# Altium footprint library DA, DD IC.PcbLib: 64 footprints (part 1 of 4)
Each footprint in its own frame and in the unit in brackets; x right, y up, seen from the top. Pads: shape width x height; smd on the part's side, far side on the other; paste and mask are expansions set on the pad; w line width, h text height; cw(c..) or ccw(c..) is an arc to the next point about the centre after c.
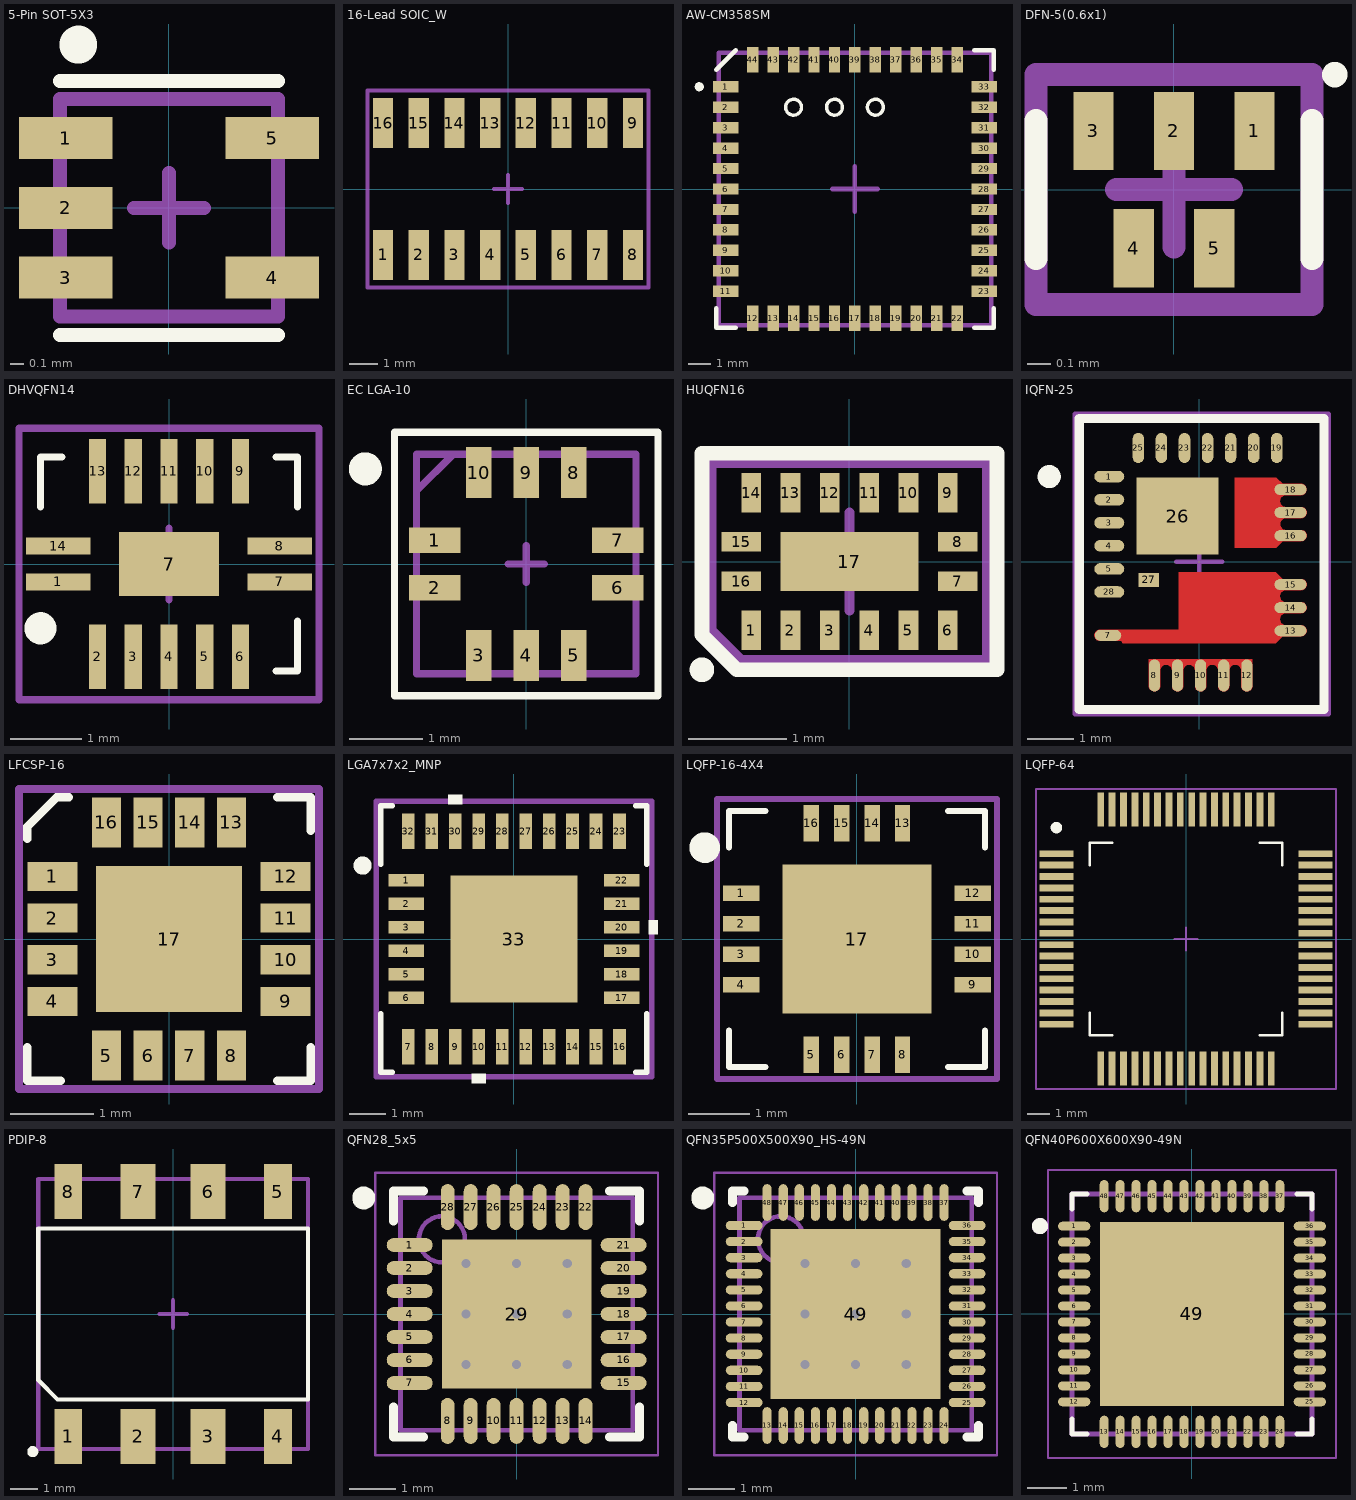
[diagram p0: the footprints below, top view; thin cyan lines are the x and y axes]

## 5-Pin SOT-5X3 [mm]
pads (5):
  rect 0.67x0.3 smd: 1(-0.74,0.5) 2(-0.74,0) 3(-0.74,-0.5) 4(0.74,-0.5) 5(0.74,0.5)
Top Overlay:
  circle w0.25: c-0.65,1.17 r0.01
  lines w0.1: -0.78,-0.91 0.78,-0.91 ; -0.78,0.91 0.78,0.91
Mechanical 15:
  lines w0.1: -0.25,0 0.25,0 ; 0,-0.25 0,0.25 ; -0.78,-0.78 -0.78,0.78 0.78,0.78 0.78,-0.78 -0.78,-0.78
3D body "SN74LVC1G14DRLRG4.STEP": height 0.59, standoff -0.01, extent -0.8,-0.8 0.8,0.8

## 16-Lead SOIC_W [mm]
pads (16):
  rect 0.72x1.78 smd: 1(-4.445,-2.34) 2(-3.175,-2.34) 3(-1.905,-2.34) 4(-0.635,-2.34) 5(0.635,-2.34) 6(1.905,-2.34) 7(3.175,-2.34) 8(4.445,-2.34) 9(4.445,2.34) 10(3.175,2.34) 11(1.905,2.34) 12(0.635,2.34) 13(-0.635,2.34) 14(-1.905,2.34) 15(-3.175,2.34) 16(-4.445,2.34)
Mechanical 15:
  lines w0.15: -0.5,0 0.5,0 ; 0,-0.5 0,0.5 ; -5,-3.5 -5,3.5 5,3.5 5,-3.5 -5,-3.5

## AW-CM358SM [mm] "AW-CM358SM"
height 1
pads (44):
  rect 1.125x0.5 smd: 1(-5.69,4.5) 2(-5.69,3.6) 3(-5.69,2.7) 4(-5.69,1.8) 6(-5.69,0) 7(-5.69,-0.9) 8(-5.69,-1.8) 9(-5.69,-2.7) 10(-5.69,-3.6) 11(-5.69,-4.5) 23(5.69,-4.5) 24(5.69,-3.6) 25(5.69,-2.7) 26(5.69,-1.8) 27(5.69,-0.9) 28(5.69,0) 29(5.69,0.9) 30(5.69,1.8) 31(5.69,2.7) 32(5.69,3.6) 33(5.69,4.5)
  rect 1.125x0.5 smd mask+0.102: 5(-5.69,0.9)
  rect 0.5x1.125 smd: 12(-4.5,-5.69) 13(-3.6,-5.69) 14(-2.7,-5.69) 15(-1.8,-5.69) 16(-0.9,-5.69) 17(0,-5.69) 18(0.9,-5.69) 19(1.8,-5.69) 20(2.7,-5.69) 21(3.6,-5.69) 22(4.5,-5.69) 34(4.5,5.69) 35(3.6,5.69) 36(2.7,5.69) 37(1.8,5.69) 38(0.9,5.69) 39(0,5.69) 40(-0.9,5.69) 41(-1.8,5.69) 42(-2.7,5.69) 43(-3.6,5.69) 44(-4.5,5.69)
Top Overlay:
  circle w0.15: c0.9,3.6 r0.35
  circle w0.15: c-0.9,3.6 r0.35
  circle w0.15: c-2.7,3.6 r0.35
  circle w0.2: c-6.85,4.5 r0.1
  lines w0.2: -6.1,-5.25 -6.1,-6.1 -5.25,-6.1 ; -6.1,5.25 -5.25,6.1 ; 5.25,-6.1 6.1,-6.1 6.1,-5.25 ; 5.25,6.1 6.1,6.1 6.1,5.25 ; -5.25,6.1 -5.25,6.1
Mechanical 15:
  lines w0.2: -1,0 1,0 ; 0,-1 0,1 ; -6,-6 -6,6 6,6 6,-6 -6,-6
3D body "User Library-AP62XX-1.step": height 1.52, standoff 0, extent -6,-6 6,6

## DFN-5(0.6x1) [mm]
pads (5):
  rect 0.175x0.34 smd mask+0.05: 1(0.35,0.255) 2(0,0.255) 3(-0.35,0.255) 4(-0.175,-0.255) 5(0.175,-0.255)
Top Overlay:
  circle w0.1: c0.7,0.5 r0.005
  lines w0.1: -0.6,-0.3 -0.6,0.3 ; 0.6,-0.3 0.6,0.3
Mechanical 15:
  lines w0.1: -0.25,0 0.25,0 ; 0,-0.25 0,0.25 ; -0.6,-0.5 -0.6,0.5 0.6,0.5 0.6,-0.5 -0.6,-0.5
3D body "DFN_04UTG_LTF.step": height 0.51, standoff 0, extent -0.546,-0.356 0.546,0.356

## DHVQFN14 [mm]
pads (15):
  rect 0.9x0.24 smd paste-0.02 mask+0.05: 1(-1.55,-0.25) 7(1.55,-0.25) 8(1.55,0.25) 14(-1.55,0.25)
  rect 0.24x0.9 smd paste-0.02 mask+0.05: 2(-1,-1.3) 3(-0.5,-1.3) 4(0,-1.3) 5(0.5,-1.3) 6(1,-1.3) 9(1,1.3) 10(0.5,1.3) 11(0,1.3) 12(-0.5,1.3) 13(-1,1.3)
  rect 1.4x0.9 smd paste-2539.97 mask+0.05: 7(0,0)
Top Overlay:
  circle w0.25: c-1.8,-0.9 r0.1
  lines w0.1: -1.8,0.8 -1.8,1.5 -1.5,1.5 ; 1.5,-1.5 1.8,-1.5 1.8,-0.8 ; 1.5,1.5 1.8,1.5 1.8,0.8
Top Paste:
  region: -0.3,0.2 -0.3,-0.2 0.3,-0.2 0.3,0.2
Mechanical 15:
  lines w0.1: -0.5,0 0.5,0 ; 0,-0.5 0,0.5 ; -2.1,-1.9 -2.1,1.9 2.1,1.9 2.1,-1.9 -2.1,-1.9
3D body "User Library-DHVQFN 14.step": height 0.85, standoff -0.02, extent -1.501,-1.251 1.501,1.251

## EC LGA-10 [mm] "3mmx3mmx1.45mm"
height 1.45
pads (10):
  rect 0.7x0.35 smd: 1(-1.25,0.325) 2(-1.25,-0.325) 6(1.25,-0.325) 7(1.25,0.325)
  rect 0.35x0.7 smd: 3(-0.65,-1.25) 4(0,-1.25) 5(0.65,-1.25) 8(0.65,1.25) 9(0,1.25) 10(-0.65,1.25)
Top Overlay:
  circle w0.25: c-2.2,1.3 r0.1
  lines w0.1: -1.8,-1.8 1.8,-1.8 1.8,1.8 -1.8,1.8 -1.8,-1.8
Mechanical 15:
  lines w0.1: -1.5,1 -1,1.5 ; -0.25,0 0.25,0 ; 0,-0.25 0,0.25 ; -1.5,-1.5 1.5,-1.5 1.5,1.5 -1.5,1.5 -1.5,-1.5

## HUQFN16 [mm] "1.6x2.4x0.5 mm"
pads (17):
  rect 0.2x0.4 smd mask+0.05: 1(-1,-0.7) 2(-0.6,-0.7) 3(-0.2,-0.7) 4(0.2,-0.7) 5(0.6,-0.7) 6(1,-0.7) 9(1,0.7) 10(0.6,0.7) 11(0.2,0.7) 12(-0.2,0.7) 13(-0.6,0.7) 14(-1,0.7)
  rect 0.4x0.2 smd mask+0.05: 7(1.1,-0.2) 8(1.1,0.2) 15(-1.1,0.2) 16(-1.1,-0.2)
  rect 1.4x0.6 smd mask+0.05: 17(0,0)
Top Overlay:
  circle w0.15: c-1.5,-1.1 r0.05
  lines w0.15: -1.5,-0.745 -1.145,-1.1 1.5,-1.1 1.5,1.1 -1.5,1.1 -1.5,-0.745
Mechanical 15:
  lines w0.1: -0.5,0 0.5,0 ; 0,-0.5 0,0.5 ; -1.4,-0.7 -1.1,-1 1.4,-1 1.4,1 -1.4,1 -1.4,-0.7
3D body "HUQFN16.STEP": height 0.53, standoff 0, extent -1.2,-0.8 1.2,0.8

## IQFN-25 [mm]
pads (27):
  rrect100% 0.65x0.25 smd paste-0.125 mask+0: 1(-1.95,1.844) 2(-1.95,1.344) 3(-1.95,0.844) 4(-1.95,0.344) 5(-1.95,-0.156) 28(-1.95,-0.656)
  rrect100% 0.575x0.24 smd paste-0.125 mask+0: 7(-1.977,-1.596)
  rrect100% 0.24x0.695 smd paste-0.125 mask-0.7: 8(-0.97,-2.464) 9(-0.47,-2.464) 10(0.03,-2.464) 11(0.53,-2.464) 12(1.03,-2.464)
  rrect100% 0.695x0.24 smd paste-0.125 mask-0.7: 13(1.977,-1.496) 14(1.977,-0.996) 15(1.977,-0.496) 16(1.977,0.564) 17(1.977,1.064) 18(1.977,1.564)
  rrect100% 0.25x0.65 smd paste-0.125 mask+0: 19(1.68,2.464) 20(1.179,2.464) 21(0.68,2.464) 22(0.18,2.464) 23(-0.32,2.464) 24(-0.82,2.464) 25(-1.32,2.464)
  rect 1.78x1.67 smd paste-0.975 mask+0: 26(-0.471,0.989)
  rect 0.45x0.3 smd paste-0.15 mask+0: 27(-1.096,-0.396)
Top Layer:
  region: 1.655,-0.226 1.806,-0.376 2.205,-0.376 2.229,-0.376 2.272,-0.394 2.306,-0.428 2.324,-0.471 2.324,-0.495 2.324,-0.497 2.324,-0.521 2.306,-0.564 2.272,-0.598 2.229,-0.616 2.205,-0.616 1.875,-0.616 1.851,-0.618 1.805,-0.637 1.77,-0.672 1.751,-0.718 1.749,-0.742 1.749,-0.749 1.751,-0.774 1.77,-0.82 1.805,-0.855 1.851,-0.874 1.875,-0.876 2.206,-0.876 2.229,-0.876 2.273,-0.894 2.306,-0.928 2.324,-0.971 2.324,-0.995 2.324,-0.997 2.324,-1.021 2.306,-1.064 2.272,-1.097 2.229,-1.116 2.205,-1.116 1.875,-1.116 1.851,-1.118 1.805,-1.137 1.77,-1.172 1.751,-1.217 1.749,-1.242 1.749,-1.249 1.751,-1.274 1.77,-1.319 1.805,-1.354 1.851,-1.373 1.875,-1.376 2.206,-1.376 2.229,-1.376 2.273,-1.394 2.306,-1.427 2.324,-1.471 2.324,-1.495 2.324,-1.498 2.324,-1.521 2.306,-1.565 2.272,-1.598 2.229,-1.616 2.206,-1.616 1.806,-1.616 1.655,-1.766 -1.654,-1.766 -1.693,-1.716 -2.157,-1.716 -2.18,-1.716 -2.224,-1.697 -2.258,-1.664 -2.276,-1.62 -2.276,-1.596 -2.276,-1.572 -2.258,-1.528 -2.224,-1.494 -2.18,-1.476 -2.157,-1.476 -0.444,-1.476 -0.444,-0.226
  region: 1.809,1.684 2.209,1.684 2.231,1.684 2.272,1.667 2.304,1.635 2.321,1.594 2.321,1.572 2.321,1.557 2.321,1.535 2.304,1.493 2.272,1.462 2.231,1.445 2.209,1.445 1.877,1.445 1.852,1.442 1.805,1.423 1.77,1.387 1.75,1.34 1.748,1.315 1.75,1.29 1.77,1.242 1.806,1.206 1.853,1.187 1.878,1.184 2.209,1.184 2.232,1.184 2.274,1.167 2.307,1.134 2.324,1.092 2.324,1.069 2.324,1.059 2.324,1.037 2.307,0.994 2.274,0.962 2.232,0.944 2.209,0.944 1.879,0.944 1.854,0.942 1.808,0.922 1.772,0.887 1.753,0.84 1.75,0.815 1.75,0.813 1.753,0.788 1.772,0.742 1.808,0.706 1.854,0.687 1.879,0.685 2.209,0.685 2.232,0.685 2.274,0.667 2.307,0.635 2.324,0.592 2.324,0.569 2.324,0.56 2.324,0.537 2.307,0.494 2.274,0.462 2.232,0.444 2.209,0.444 1.809,0.444 1.669,0.304 0.77,0.304 0.77,1.824 1.669,1.824
  region: 1.149,-2.116 1.149,-2.696 1.149,-2.718 1.132,-2.759 1.101,-2.79 1.06,-2.807 1.037,-2.807 1.02,-2.807 0.998,-2.807 0.958,-2.79 0.927,-2.759 0.91,-2.718 0.91,-2.696 0.91,-2.366 0.909,-2.366 0.909,-2.362 0.907,-2.336 0.887,-2.289 0.851,-2.254 0.804,-2.234 0.779,-2.232 0.754,-2.234 0.707,-2.254 0.671,-2.289 0.652,-2.336 0.649,-2.362 0.649,-2.696 0.649,-2.718 0.632,-2.758 0.601,-2.79 0.56,-2.807 0.538,-2.807 0.52,-2.807 0.498,-2.807 0.458,-2.79 0.426,-2.758 0.409,-2.718 0.409,-2.696 0.409,-2.362 0.407,-2.336 0.388,-2.289 0.352,-2.254 0.305,-2.234 0.279,-2.232 0.254,-2.234 0.207,-2.254 0.171,-2.289 0.152,-2.336 0.149,-2.362 0.149,-2.696 0.149,-2.718 0.132,-2.759 0.101,-2.79 0.061,-2.807 0.039,-2.807 0.021,-2.807 -0.001,-2.807 -0.042,-2.79 -0.073,-2.758 -0.09,-2.718 -0.09,-2.696 -0.09,-2.362 -0.093,-2.336 -0.112,-2.289 -0.148,-2.254 -0.195,-2.234 -0.22,-2.232 -0.246,-2.234 -0.293,-2.254 -0.329,-2.289 -0.348,-2.336 -0.35,-2.362 -0.35,-2.696 -0.35,-2.718 -0.367,-2.758 -0.399,-2.79 -0.439,-2.807 -0.461,-2.807 -0.48,-2.807 -0.501,-2.807 -0.542,-2.79 -0.573,-2.759 -0.59,-2.718 -0.59,-2.696 -0.59,-2.366 -0.591,-2.366 -0.591,-2.361 -0.593,-2.336 -0.613,-2.289 -0.648,-2.253 -0.695,-2.234 -0.721,-2.232 -0.746,-2.234 -0.793,-2.253 -0.828,-2.289 -0.848,-2.336 -0.85,-2.361 -0.85,-2.696 -0.85,-2.718 -0.867,-2.758 -0.898,-2.79 -0.939,-2.807 -0.961,-2.807 -0.979,-2.807 -1.001,-2.807 -1.042,-2.79 -1.073,-2.759 -1.09,-2.718 -1.09,-2.696 -1.091,-2.696 -1.091,-2.116
Top Overlay:
  circle w0.25: c-3.25,1.844 r0.125
  lines w0.2: -2.6,-3.2 -2.6,3.1 2.7,3.1 2.7,-3.2 -2.6,-3.2
Top Paste:
  region: -0.571,0.174 -1.35,0.174 -1.35,0.894 -0.57,0.894
  region: -0.571,1.094 -1.35,1.094 -1.35,1.814 -0.571,1.814
  region: 0.789,-0.236 1.559,-0.236 1.559,-0.896 0.789,-0.896
  region: 0.409,1.094 -0.37,1.094 -0.37,1.814 0.41,1.814
  region: 0.409,0.174 -0.37,0.174 -0.37,0.894 0.41,0.894
  region: 0.59,-1.756 -0.431,-1.756 -0.431,-1.096 0.59,-1.096
  region: 0.59,-0.896 -0.431,-0.896 -0.431,-0.236 0.59,-0.236
  region: -0.816,-1.756 -1.315,-1.756 -1.315,-1.487 -0.816,-1.487
  region: 1.56,1.164 1.56,1.804 0.789,1.804 0.789,1.164
  region: 1.56,0.319 1.56,0.959 0.789,0.959 0.789,0.319
  region: 0.789,-1.096 1.559,-1.096 1.559,-1.756 0.789,-1.756
  region: -1.271,-0.271 -0.921,-0.271 -0.921,-0.521 -1.271,-0.521
  lines w0.24: -2.076,-1.596 -1.825,-1.596 ; 1.885,-1.496 2.135,-1.496 ; 1.885,-0.996 2.135,-0.996 ; 1.885,-0.496 2.135,-0.496 ; 1.884,0.564 2.135,0.564 ; 1.884,1.064 2.135,1.064 ; 1.884,1.564 2.135,1.564
  lines w0.25: -2.076,-0.656 -1.825,-0.656 ; -2.076,-0.156 -1.825,-0.156 ; -2.076,0.344 -1.825,0.344 ; -2.076,0.844 -1.825,0.844 ; -2.076,1.344 -1.825,1.344 ; -2.076,1.844 -1.825,1.844 ; -1.32,2.344 -1.32,2.594 ; -0.97,-2.621 -0.97,-2.241 ; -0.82,2.344 -0.82,2.594 ; -0.47,-2.621 -0.47,-2.241 ; -0.32,2.344 -0.32,2.594 ; 0.029,-2.621 0.029,-2.241 ; 0.18,2.344 0.18,2.594 ; 0.53,-2.621 0.53,-2.241 ; 0.68,2.344 0.68,2.594 ; 1.03,-2.621 1.03,-2.241 ; 1.179,2.344 1.179,2.594 ; 1.68,2.344 1.68,2.594
Mechanical 15:
  lines w0.1: -0.5,0 0.5,0 ; 0,-0.5 0,0.5 ; -2.7,-3.3 2.8,-3.3 2.8,3.2 -2.7,3.2 -2.7,-3.3
3D body "PG-IQFN-25-1_Z8B00190048_V02_3D.stp": height 1.01, standoff 0, extent -1.97,-2.516 2.03,2.484

## LFCSP-16 [mm]
pads (17):
  rect 0.6x0.35 smd mask+0.05: 1(-1.4,0.75) 2(-1.4,0.25) 3(-1.4,-0.25) 4(-1.4,-0.75) 9(1.4,-0.75) 10(1.4,-0.25) 11(1.4,0.25) 12(1.4,0.75)
  rect 0.35x0.6 smd mask+0.05: 5(-0.75,-1.4) 6(-0.25,-1.4) 7(0.25,-1.4) 8(0.75,-1.4) 13(0.75,1.4) 14(0.25,1.4) 15(-0.25,1.4) 16(-0.75,1.4)
  rect 1.75x1.75 smd mask+0.05: 17(0,0)
Top Overlay:
  lines w0.1: -1.7,-1.3 -1.7,-1.7 -1.3,-1.7 ; -1.7,1.2 -1.7,1.35 -1.35,1.7 -1.2,1.7 ; 1.3,-1.7 1.7,-1.7 1.7,-1.3 ; 1.3,1.7 1.7,1.7 1.7,1.3
Mechanical 15:
  lines w0.1: -0.5,0 0.5,0 ; 0,-0.5 0,0.5 ; -1.8,-1.8 1.8,-1.8 1.8,1.8 -1.8,1.8 -1.8,-1.8
3D body "User Library-ADP1162 LFCSP16.step": height 0.73, standoff -0.02, extent -1.501,-1.501 1.501,1.501

## LGA7x7x2_MNP [mil]
pads (33):
  rect 39x14 smd paste+0 mask+0: 1(-117.5,63.98) 2(-117.5,38.39) 3(-117.5,12.8) 4(-117.5,-12.8) 5(-117.5,-38.39) 6(-117.5,-63.98) 17(117.5,-63.98) 18(117.5,-38.39) 19(117.5,-12.8) 20(117.5,12.8) 21(117.5,38.39) 22(117.5,63.98)
  rect 14x39 smd paste+0 mask+0: 7(-115.16,-117.5) 8(-89.57,-117.5) 9(-63.98,-117.5) 10(-38.39,-117.5) 11(-12.8,-117.5) 12(12.8,-117.5) 13(38.39,-117.5) 14(63.98,-117.5) 15(89.57,-117.5) 16(115.16,-117.5) 23(115.16,117.5) 24(89.57,117.5) 25(63.98,117.5) 26(38.39,117.5) 27(12.8,117.5) 28(-12.8,117.5) 29(-38.39,117.5) 30(-63.98,117.5) 31(-89.57,117.5) 32(-115.16,117.5)
  rect 138x138 smd paste-68.5 mask+0: 33(0,0)
Top Overlay:
  circle w9.84: c-165,80 r5
  region: -30.89,-147 -45.89,-147 -45.89,-157 -30.89,-157
  region: 147,20.3 157,20.3 157,5.3 147,5.3
  region: -56.48,147 -71.48,147 -71.48,157 -56.48,157
  lines w6: -145,-81.35 -145,-145 -132.53,-145 ; -145,81.35 -145,145 -132.53,145 ; 132.53,-145 145,-145 145,-81.35 ; 132.53,145 145,145 145,81.35
Top Paste:
  region: -3.94,65.06 -65.06,65.06 -65.06,3.94 -3.94,3.94
  region: -3.94,-3.94 -65.06,-3.94 -65.06,-65.06 -3.94,-65.06
  region: 65.06,65.06 3.94,65.06 3.94,3.94 65.06,3.94
  region: 65.06,-3.94 3.94,-3.94 3.94,-65.06 65.06,-65.06
Mechanical 15:
  lines w6: -150,-150 -150,-80.98 -150,80.98 -150,150 -132.16,150 132.16,150 150,150 150,80.98 150,-80.98 150,-150 132.16,-150 -132.16,-150 -150,-150
3D body "LGA7x7x2_MNP.step": height 83.11, standoff 0, extent -140,-140 140,140

## LQFP-16-4X4 [mm]
pads (17):
  rect 0.6x0.25 smd mask+0.05: 1(-1.9,0.75) 2(-1.9,0.25) 3(-1.9,-0.25) 4(-1.9,-0.75) 9(1.9,-0.75) 10(1.9,-0.25) 11(1.9,0.25) 12(1.9,0.75)
  rect 0.25x0.6 smd mask+0.05: 5(-0.75,-1.9) 6(-0.25,-1.9) 7(0.25,-1.9) 8(0.75,-1.9) 13(0.75,1.9) 14(0.25,1.9) 15(-0.25,1.9) 16(-0.75,1.9)
  rect 2.45x2.45 smd mask+0.05: 17(0,0)
Top Overlay:
  circle w0.25: c-2.5,1.5 r0.127
  lines w0.1: -2.1,-1.5 -2.1,-2.1 -1.5,-2.1 ; -2.1,1.5 -2.1,2.1 -1.5,2.1 ; 1.5,-2.1 2.1,-2.1 2.1,-1.5 ; 1.5,2.1 2.1,2.1 2.1,1.5
Mechanical 15:
  lines w0.1: -0.5,0 0.5,0 ; 0,-0.5 0,0.5 ; -2.3,-2.3 2.3,-2.3 2.3,2.3 -2.3,2.3 -2.3,-2.3
3D body "User Library-WQFN-16 4x4mm 0_5mmPitch.step": height 0.8, standoff -0.01, extent -2.01,-2.01 2.01,2.01

## LQFP-64 [mm]
pads (64):
  rect 1.5x0.3 smd mask+0.05: 1(-5.7,3.75) 2(-5.7,3.25) 3(-5.7,2.75) 4(-5.7,2.25) 5(-5.7,1.75) 6(-5.7,1.25) 7(-5.7,0.75) 8(-5.7,0.25) 9(-5.7,-0.25) 10(-5.7,-0.75) 11(-5.7,-1.25) 12(-5.7,-1.75) 13(-5.7,-2.25) 14(-5.7,-2.75) 15(-5.7,-3.25) 16(-5.7,-3.75) 33(5.7,-3.75) 34(5.7,-3.25) 35(5.7,-2.75) 35(5.7,-1.25) 36(5.7,-2.25) 37(5.7,-1.75) 39(5.7,-0.75) 40(5.7,-0.25) 41(5.7,0.25) 42(5.7,0.75) 43(5.7,1.25) 44(5.7,1.75) 45(5.7,2.25) 46(5.7,2.75) 47(5.7,3.25) 48(5.7,3.75)
  rect 0.3x1.5 smd mask+0.05: 17(-3.75,-5.7) 18(-3.25,-5.7) 19(-2.75,-5.7) 20(-2.25,-5.7) 21(-1.75,-5.7) 22(-1.25,-5.7) 23(-0.75,-5.7) 24(-0.25,-5.7) 25(0.25,-5.7) 26(0.75,-5.7) 27(1.25,-5.7) 28(1.75,-5.7) 29(2.25,-5.7) 30(2.75,-5.7) 31(3.25,-5.7) 32(3.75,-5.7) 49(3.75,5.7) 50(3.25,5.7) 51(2.75,5.7) 52(2.25,5.7) 53(1.75,5.7) 54(1.25,5.7) 55(0.75,5.7) 56(0.25,5.7) 57(-0.25,5.7) 58(-0.75,5.7) 59(-1.25,5.7) 60(-1.75,5.7) 61(-2.25,5.7) 62(-2.75,5.7) 63(-3.25,5.7) 64(-3.75,5.7)
Top Overlay:
  circle w0.25: c-5.7,4.9 r0.127
  lines w0.1: -4.238,-3.237 -4.238,-4.237 -3.238,-4.237 ; -4.237,3.238 -4.237,4.238 -3.237,4.238 ; 3.237,-4.238 4.237,-4.238 4.237,-3.238 ; 3.238,4.237 4.238,4.237 4.238,3.237
Mechanical 15:
  lines w0.1: -0.5,0 0.5,0 ; 0,-0.5 0,0.5 ; -6.6,-6.6 6.6,-6.6 6.6,6.6 -6.6,6.6 -6.6,-6.6
3D body "User Library-LQFP64-2.STEP": height 1.62, standoff -0.01, extent -6.072,-6.072 6.072,6.072

## PDIP-8 [mm]
height 3.6
pads (8):
  rect 1x2 smd: 1(-3.81,-4.45) 4(3.81,-4.45) 5(3.81,4.45) 8(-3.81,4.45)
  rect 1.27x2 smd: 2(-1.27,-4.45) 3(1.27,-4.45) 6(1.27,4.45) 7(-1.27,4.45)
Top Overlay:
  circle w0.2: c-5.1,-5 r0.1
  lines w0.15: -4.9,-2.4 -4.2,-3.1 4.9,-3.1 4.9,3.1 -4.9,3.1 -4.9,-2.4
Mechanical 13:
  lines w0.15: -0.5,0 0.5,0 ; 0,-0.5 0,0.5 ; -4.9,-4.9 -4.9,4.9 4.9,4.9 4.9,-4.9 -4.9,-4.9
3D body "User Library-PDIP8_GW.step": height 4.32, standoff 0, extent -4.828,-5.15 4.828,5.15

## QFN28_5x5 [mm] "QFN, 28-Leads, Body 5,00x5,00mm, Pitch 0,50mm, Thermal Pad 3,25x3,25mm, IPC Medium Density"
height 0.8
pads (29):
  oval 1x0.3 smd: 1(-2.325,1.5) 2(-2.325,1) 3(-2.325,0.5) 4(-2.325,0) 5(-2.325,-0.5) 6(-2.325,-1) 7(-2.325,-1.5) 15(2.325,-1.5) 16(2.325,-1) 17(2.325,-0.5) 18(2.325,0) 19(2.325,0.5) 20(2.325,1) 21(2.325,1.5)
  oval 0.3x1 smd: 8(-1.5,-2.325) 9(-1,-2.325) 10(-0.5,-2.325) 11(0,-2.325) 12(0.5,-2.325) 13(1,-2.325) 14(1.5,-2.325) 22(1.5,2.325) 23(1,2.325) 24(0.5,2.325) 25(0,2.325) 26(-0.5,2.325) 27(-1,2.325) 28(-1.5,2.325)
  rect 3.25x3.25 smd: 29(0,0)
via 1.1,-1.1 diameter 0.5 hole 0.2
via 0,-1.1 diameter 0.5 hole 0.2
via -1.1,-1.1 diameter 0.5 hole 0.2
via 1.1,0 diameter 0.5 hole 0.2
via 0,0 diameter 0.5 hole 0.2
via -1.1,0 diameter 0.5 hole 0.2
via 1.1,1.1 diameter 0.5 hole 0.2
via 0,1.1 diameter 0.5 hole 0.2
via -1.1,1.1 diameter 0.5 hole 0.2
Top Overlay:
  circle w0.25: c-3.325,2.525 r0.125
  lines w0.2: -2.675,-2.025 -2.675,-2.675 -2.025,-2.675 ; -2.675,2.025 -2.675,2.675 -2.025,2.675 ; 2.025,-2.675 2.675,-2.675 2.675,-2.025 ; 2.025,2.675 2.675,2.675 2.675,2.025
Mechanical 13:
  circle w0.1: c-1.625,1.625 r0.5
  lines w0.1: -2.525,-2.525 2.525,-2.525 2.525,2.525 -2.525,2.525 -2.525,-2.525
Mechanical 15:
  lines w0.05: -3.075,-3.075 3.075,-3.075 3.075,3.075 -3.075,3.075 -3.075,-3.075
  lines w0.1: -0.5,0 0.5,0 ; 0,-0.5 0,0.5
3D body: height 0.8, standoff 0, extent -2.525,-2.525 2.525,2.525

## QFN35P500X500X90_HS-49N [mm] "QFN, 48-Leads, Body 5,00x5,00mm, Pitch 0,35mm, Thermal Pad 3,70x3,70mm, IPC Medium Density"
height 0.9
pads (49):
  oval 0.8x0.2 smd: 1(-2.425,1.925) 2(-2.425,1.575) 3(-2.425,1.225) 4(-2.425,0.875) 5(-2.425,0.525) 6(-2.425,0.175) 7(-2.425,-0.175) 8(-2.425,-0.525) 9(-2.425,-0.875) 10(-2.425,-1.225) 11(-2.425,-1.575) 12(-2.425,-1.925) 25(2.425,-1.925) 26(2.425,-1.575) 27(2.425,-1.225) 28(2.425,-0.875) 29(2.425,-0.525) 30(2.425,-0.175) 31(2.425,0.175) 32(2.425,0.525) 33(2.425,0.875) 34(2.425,1.225) 35(2.425,1.575) 36(2.425,1.925)
  oval 0.2x0.8 smd: 13(-1.925,-2.425) 14(-1.575,-2.425) 15(-1.225,-2.425) 16(-0.875,-2.425) 17(-0.525,-2.425) 18(-0.175,-2.425) 19(0.175,-2.425) 20(0.525,-2.425) 21(0.875,-2.425) 22(1.225,-2.425) 23(1.575,-2.425) 24(1.925,-2.425) 37(1.925,2.425) 38(1.575,2.425) 39(1.225,2.425) 40(0.875,2.425) 41(0.525,2.425) 42(0.175,2.425) 43(-0.175,2.425) 44(-0.525,2.425) 45(-0.875,2.425) 46(-1.225,2.425) 47(-1.575,2.425) 48(-1.925,2.425)
  rect 3.7x3.7 smd: 49(0,0)
via 0,0 diameter 0.5 hole 0.2
via -1.1,1.1 diameter 0.5 hole 0.2
via 0,1.1 diameter 0.5 hole 0.2
via 1.1,1.1 diameter 0.5 hole 0.2
via -1.1,0 diameter 0.5 hole 0.2
via 1.1,0 diameter 0.5 hole 0.2
via -1.1,-1.1 diameter 0.5 hole 0.2
via 0,-1.1 diameter 0.5 hole 0.2
via 1.1,-1.1 diameter 0.5 hole 0.2
Top Overlay:
  circle w0.25: c-3.325,2.525 r0.125
  lines w0.2: -2.675,-2.425 -2.675,-2.675 -2.425,-2.675 ; -2.675,2.425 -2.675,2.675 -2.425,2.675 ; 2.425,-2.675 2.675,-2.675 2.675,-2.425 ; 2.425,2.675 2.675,2.675 2.675,2.425
Mechanical 13:
  circle w0.1: c-1.625,1.625 r0.5
  lines w0.1: -2.525,-2.525 -2.525,2.525 2.525,2.525 2.525,-2.525 -2.525,-2.525
Mechanical 15:
  lines w0.05: -3.075,-3.075 -3.075,3.075 3.075,3.075 3.075,-3.075 -3.075,-3.075
  lines w0.1: -0.5,0 0.5,0 ; 0,-0.5 0,0.5
3D body: height 0.9, standoff 0, extent -2.525,-2.525 2.525,2.525

## QFN40P600X600X90-49N [mm]
pads (49):
  oval 0.81x0.22 smd: 1(-2.95,2.2) 2(-2.95,1.8) 3(-2.95,1.4) 4(-2.95,1) 5(-2.95,0.6) 6(-2.95,0.2) 7(-2.95,-0.2) 8(-2.95,-0.6) 9(-2.95,-1) 10(-2.95,-1.4) 11(-2.95,-1.8) 12(-2.95,-2.2) 25(2.95,-2.2) 26(2.95,-1.8) 27(2.95,-1.4) 28(2.95,-1) 29(2.95,-0.6) 30(2.95,-0.2) 31(2.95,0.2) 32(2.95,0.6) 33(2.95,1) 34(2.95,1.4) 35(2.95,1.8) 36(2.95,2.2)
  oval 0.22x0.81 smd: 13(-2.2,-2.95) 14(-1.8,-2.95) 15(-1.4,-2.95) 16(-1,-2.95) 17(-0.6,-2.95) 18(-0.2,-2.95) 19(0.2,-2.95) 20(0.6,-2.95) 21(1,-2.95) 22(1.4,-2.95) 23(1.8,-2.95) 24(2.2,-2.95) 37(2.2,2.95) 38(1.8,2.95) 39(1.4,2.95) 40(1,2.95) 41(0.6,2.95) 42(0.2,2.95) 43(-0.2,2.95) 44(-0.6,2.95) 45(-1,2.95) 46(-1.4,2.95) 47(-1.8,2.95) 48(-2.2,2.95)
  rect 4.6x4.6 smd paste-3: 49(0,0)
Top Overlay:
  circle w0.2: c-3.805,2.2 r0.1
  lines w0.127: -3,-2.63 -3,-3 -2.63,-3 ; -3,2.63 -3,3 -2.63,3 ; 2.63,-3 3,-3 3,-2.63 ; 2.63,3 3,3 3,2.63
Top Paste:
  region: 1.965,0.335 0.335,0.335 0.335,1.965 1.965,1.965
  region: 1.965,-1.965 0.335,-1.965 0.335,-0.335 1.965,-0.335
  region: -0.335,-1.965 -1.965,-1.965 -1.965,-0.335 -0.335,-0.335
  region: -0.335,0.335 -1.965,0.335 -1.965,1.965 -0.335,1.965
Mechanical 13:
  circle w0.2: c-3.805,2.2 r0.1
  lines w0.127: -3,-3 -3,3 3,3 3,-3 -3,-3
Mechanical 15:
  lines w0.05: -3.605,-3.605 -3.605,3.605 3.605,3.605 3.605,-3.605 -3.605,-3.605
3D body "QFN48_NRF52832_NOR.step": height 0.94, standoff 0, extent -2.997,-2.997 2.997,2.997